# Altium integrated library LEMO Unipole And Multipole Type Connectors.IntLib: 1566 symbols (part 4 of 13) (continued)
## EEG.2K.306.CLN
designator J?
Fixed receptacle, nut fixing, with straight contacts for printed circuit (back panel mounting), Key (G), 2K series, Multipole Type with 6 Contacts; Manufacturer: LEMO; PartNumber: EEG.2K.306.CLN; Number of contacts: 6; Contact Diameter: 1.3 mm; AWG: 20; Rated Current(A): 12; DatasheetVersion: Jun-14; PackageReference: EEG.2K.306.CLN; PackageDescription: Fixed receptacle, nut fixing, with straight contacts for printed circuit (back panel mounting), Key(G) for Printed Circuit; Supplier 1: Mouser; Supplier Part Number 1: 736-EEG2K306CLN; Supplier 2: Digi-Key; Supplier Part Number 2: EEG.2K.306.CLN-ND; ComponentLink1Description: Manufacturer URL; ComponentLink1URL: http://www.lemo.com; ComponentLink2Description: Datasheet; ComponentLink2URL: http://intra.lemo.ch/catalog/ROW/UK_English/unipole_multipole.pdf
footprint EEG.2K.306.CLN (Socket, Female, Body 20mm dia. Height 25.8 mm, Through hole)
pins: 1, 2, 3, 4, 5, 6

## EEG.2K.306.CLV
designator J?
Fixed receptacle, nut fixing, with elbow contacts for printed circuit (back panel mounting), Key (G), 2K series, Multipole Type with 6 Contacts; Manufacturer: LEMO; PartNumber: EEG.2K.306.CLV; Number of contacts: 6; Contact Diameter: 1.3 mm; AWG: 20; Rated Current(A): 0; DatasheetVersion: Jun-14; PackageReference: EEG.2K.306.CLV; PackageDescription: Fixed receptacle, nut fixing, with elbow contacts for printed circuit (back panel mounting), Key(G) for Printed Circuit; Supplier 1: Mouser; Supplier Part Number 1: 736-EEG2K306CLV; Supplier 2: Digi-Key; Supplier Part Number 2: EEG.2K.306.CLV-ND; ComponentLink1Description: Manufacturer URL; ComponentLink1URL: http://www.lemo.com; ComponentLink2Description: Datasheet; ComponentLink2URL: http://intra.lemo.ch/catalog/ROW/UK_English/unipole_multipole.pdf
footprint EEG.2K.306.CLV (Socket, Female, Body 20mm dia. Height 26.6 mm, Through hole)
pins: 1, 2, 3, 4, 5, 6

## EEG.2K.307.CLN
designator J?
Fixed receptacle, nut fixing, with straight contacts for printed circuit (back panel mounting), Key (G), 2K series, Multipole Type with 7 Contacts; Manufacturer: LEMO; PartNumber: EEG.2K.307.CLN; Number of contacts: 7; Contact Diameter: 1.3 mm; AWG: 20; Rated Current(A): 11; DatasheetVersion: Jun-14; PackageReference: EEG.2K.307.CLN; PackageDescription: Fixed receptacle, nut fixing, with straight contacts for printed circuit (back panel mounting), Key(G) for Printed Circuit; Supplier 1: Mouser; Supplier Part Number 1: 736-EEG2K307CLN; Supplier 2: Digi-Key; Supplier Part Number 2: EEG.2K.307.CLN-ND; ComponentLink1Description: Manufacturer URL; ComponentLink1URL: http://www.lemo.com; ComponentLink2Description: Datasheet; ComponentLink2URL: http://intra.lemo.ch/catalog/ROW/UK_English/unipole_multipole.pdf
footprint EEG.2K.307.CLN (Socket, Female, Body 20mm dia. Height 25.8 mm, Through hole)
pins: 1, 2, 3, 4, 5, 6, 7

## EEG.2K.307.CLV
designator J?
Fixed receptacle, nut fixing, with elbow contacts for printed circuit (back panel mounting), Key (G), 2K series, Multipole Type with 7 Contacts; Manufacturer: LEMO; PartNumber: EEG.2K.307.CLV; Number of contacts: 7; Contact Diameter: 1.3 mm; AWG: 20; Rated Current(A): 0; DatasheetVersion: Jun-14; PackageReference: EEG.2K.307.CLV; PackageDescription: Fixed receptacle, nut fixing, with elbow contacts for printed circuit (back panel mounting), Key(G) for Printed Circuit; ComponentLink1Description: Manufacturer URL; ComponentLink1URL: http://www.lemo.com; ComponentLink2Description: Datasheet; ComponentLink2URL: http://intra.lemo.ch/catalog/ROW/UK_English/unipole_multipole.pdf
footprint EEG.2K.307.CLV (Socket, Female, Body 20mm dia. Height 26.6 mm, Through hole)
pins: 1, 2, 3, 4, 5, 6, 7

## EEG.2K.308.CLN
designator J?
Fixed receptacle, nut fixing, with straight contacts for printed circuit (back panel mounting), Key (G), 2K series, Multipole Type with 8 Contacts; Manufacturer: LEMO; PartNumber: EEG.2K.308.CLN; Number of contacts: 8; Contact Diameter: 0.9 mm; AWG: 22; Rated Current(A): 10; DatasheetVersion: Jun-14; PackageReference: EEG.2K.308.CLN; PackageDescription: Fixed receptacle, nut fixing, with straight contacts for printed circuit (back panel mounting), Key(G) for Printed Circuit; ComponentLink1Description: Manufacturer URL; ComponentLink1URL: http://www.lemo.com; ComponentLink2Description: Datasheet; ComponentLink2URL: http://intra.lemo.ch/catalog/ROW/UK_English/unipole_multipole.pdf
footprint EEG.2K.308.CLN (Socket, Female, Body 20mm dia. Height 25.8 mm, Through hole)
pins: 1, 2, 3, 4, 5, 6, 7, 8

## EEG.2K.308.CLV
designator J?
Fixed receptacle, nut fixing, with elbow contacts for printed circuit (back panel mounting), Key (G), 2K series, Multipole Type with 8 Contacts; Manufacturer: LEMO; PartNumber: EEG.2K.308.CLV; Number of contacts: 8; Contact Diameter: 0.9 mm; AWG: 22; Rated Current(A): 6; DatasheetVersion: Jun-14; PackageReference: EEG.2K.308.CLV; PackageDescription: Fixed receptacle, nut fixing, with elbow contacts for printed circuit (back panel mounting), Key(G) for Printed Circuit; ComponentLink1Description: Manufacturer URL; ComponentLink1URL: http://www.lemo.com; ComponentLink2Description: Datasheet; ComponentLink2URL: http://intra.lemo.ch/catalog/ROW/UK_English/unipole_multipole.pdf
footprint EEG.2K.308.CLV (Socket, Female, Body 20mm dia. Height 26.6 mm, Through hole)
pins: 1, 2, 3, 4, 5, 6, 7, 8

## EEG.2K.310.CLN
designator J?
Fixed receptacle, nut fixing, with straight contacts for printed circuit (back panel mounting), Key (G), 2K series, Multipole Type with 10 Contacts; Manufacturer: LEMO; PartNumber: EEG.2K.310.CLN; Number of contacts: 10; Contact Diameter: 0.9 mm; AWG: 22; Rated Current(A): 8; DatasheetVersion: Jun-14; PackageReference: EEG.2K.310.CLN; PackageDescription: Fixed receptacle, nut fixing, with straight contacts for printed circuit (back panel mounting), Key(G) for Printed Circuit; Supplier 1: Mouser; Supplier Part Number 1: 736-EEG2K310CLN; Supplier 2: Digi-Key; Supplier Part Number 2: EEG.2K.310.CLN-ND; ComponentLink1Description: Manufacturer URL; ComponentLink1URL: http://www.lemo.com; ComponentLink2Description: Datasheet; ComponentLink2URL: http://intra.lemo.ch/catalog/ROW/UK_English/unipole_multipole.pdf
footprint EEG.2K.310.CLN (Socket, Female, Body 20mm dia. Height 25.8 mm, Through hole)
pins: 1, 2, 3, 4, 5, 6, 7, 8, 9, 10

## EEG.2K.312.CLN
designator J?
Fixed receptacle, nut fixing, with straight contacts for printed circuit (back panel mounting), Key (G), 2K series, Multipole Type with 12 Contacts; Manufacturer: LEMO; PartNumber: EEG.2K.312.CLN; Number of contacts: 12; Contact Diameter: 0.7 mm; AWG: 24; Rated Current(A): 7; DatasheetVersion: Jun-14; PackageReference: EEG.2K.312.CLN; PackageDescription: Fixed receptacle, nut fixing, with straight contacts for printed circuit (back panel mounting), Key(G) for Printed Circuit; Supplier 1: Mouser; Supplier Part Number 1: 736-EEG2K312CLN; Supplier 2: Digi-Key; Supplier Part Number 2: EEG.2K.312.CLN-ND; ComponentLink1Description: Manufacturer URL; ComponentLink1URL: http://www.lemo.com; ComponentLink2Description: Datasheet; ComponentLink2URL: http://intra.lemo.ch/catalog/ROW/UK_English/unipole_multipole.pdf
footprint EEG.2K.312.CLN (Socket, Female, Body 20mm dia. Height 25.8 mm, Through hole)
pins: 1, 2, 3, 4, 5, 6, 7, 8, 9, 10, 11, 12

## EEG.2K.314.CLN
designator J?
Fixed receptacle, nut fixing, with straight contacts for printed circuit (back panel mounting), Key (G), 2K series, Multipole Type with 14 Contacts; Manufacturer: LEMO; PartNumber: EEG.2K.314.CLN; Number of contacts: 14; Contact Diameter: 0.7 mm; AWG: 24; Rated Current(A): 6.5; DatasheetVersion: Jun-14; PackageReference: EEG.2K.314.CLN; PackageDescription: Fixed receptacle, nut fixing, with straight contacts for printed circuit (back panel mounting), Key(G) for Printed Circuit; Supplier 1: Mouser; Supplier Part Number 1: 736-EEG2K314CLN; Supplier 2: Digi-Key; Supplier Part Number 2: EEG.2K.314.CLN-ND; ComponentLink1Description: Manufacturer URL; ComponentLink1URL: http://www.lemo.com; ComponentLink2Description: Datasheet; ComponentLink2URL: http://intra.lemo.ch/catalog/ROW/UK_English/unipole_multipole.pdf
footprint EEG.2K.314.CLN (Socket, Female, Body 20mm dia. Height 25.8 mm, Through hole)
pins: 1, 2, 3, 4, 5, 6, 7, 8, 9, 10, 11, 12, 13, 14

## EEG.2K.316.CLN
designator J?
Fixed receptacle, nut fixing, with straight contacts for printed circuit (back panel mounting), Key (G), 2K series, Multipole Type with 16 Contacts; Manufacturer: LEMO; PartNumber: EEG.2K.316.CLN; Number of contacts: 16; Contact Diameter: 0.7 mm; AWG: 24; Rated Current(A): 6; DatasheetVersion: Jun-14; PackageReference: EEG.2K.316.CLN; PackageDescription: Fixed receptacle, nut fixing, with straight contacts for printed circuit (back panel mounting), Key(G) for Printed Circuit; Supplier 1: Mouser; Supplier Part Number 1: 736-EEG2K316CLN; Supplier 2: Digi-Key; Supplier Part Number 2: EEG.2K.316.CLN-ND; ComponentLink1Description: Manufacturer URL; ComponentLink1URL: http://www.lemo.com; ComponentLink2Description: Datasheet; ComponentLink2URL: http://intra.lemo.ch/catalog/ROW/UK_English/unipole_multipole.pdf
footprint EEG.2K.316.CLN (Socket, Female, Body 20mm dia. Height 25.8 mm, Through hole)
pins: 1, 2, 3, 4, 5, 6, 7, 8, 9, 10, 11, 12, 13, 14, 15, 16

## EEG.2K.318.CLN
designator J?
Fixed receptacle, nut fixing, with straight contacts for printed circuit (back panel mounting), Key (G), 2K series, Multipole Type with 18 Contacts; Manufacturer: LEMO; PartNumber: EEG.2K.318.CLN; Number of contacts: 18; Contact Diameter: 0.7 mm; AWG: 24; Rated Current(A): 5.5; DatasheetVersion: Jun-14; PackageReference: EEG.2K.318.CLN; PackageDescription: Fixed receptacle, nut fixing, with straight contacts for printed circuit (back panel mounting), Key(G) for Printed Circuit; ComponentLink1Description: Manufacturer URL; ComponentLink1URL: http://www.lemo.com; ComponentLink2Description: Datasheet; ComponentLink2URL: http://intra.lemo.ch/catalog/ROW/UK_English/unipole_multipole.pdf
footprint EEG.2K.318.CLN (Socket, Female, Body 20mm dia. Height 25.8 mm, Through hole)
pins: 1, 2, 3, 4, 5, 6, 7, 8, 9, 10, 11, 12, 13, 14, 15, 16, 17, 18

## EEG.2K.319.CLN
designator J?
Fixed receptacle, nut fixing, with straight contacts for printed circuit (back panel mounting), Key (G), 2K series, Multipole Type with 19 Contacts; Manufacturer: LEMO; PartNumber: EEG.2K.319.CLN; Number of contacts: 19; Contact Diameter: 0.7 mm; AWG: 24; Rated Current(A): 5; DatasheetVersion: Jun-14; PackageReference: EEG.2K.319.CLN; PackageDescription: Fixed receptacle, nut fixing, with straight contacts for printed circuit (back panel mounting), Key(G) for Printed Circuit; Supplier 1: Mouser; Supplier Part Number 1: 736-EEG2K319CLN; Supplier 2: Digi-Key; Supplier Part Number 2: EEG.2K.319.CLN-ND; ComponentLink1Description: Manufacturer URL; ComponentLink1URL: http://www.lemo.com; ComponentLink2Description: Datasheet; ComponentLink2URL: http://intra.lemo.ch/catalog/ROW/UK_English/unipole_multipole.pdf
footprint EEG.2K.319.CLN (Socket, Female, Body 20mm dia. Height 25.8 mm, Through hole)
pins: 1, 2, 3, 4, 5, 6, 7, 8, 9, 10, 11, 12, 13, 14, 15, 16, 17, 18, 19

## EEG.3B.310.CLN
designator J?
Fixed receptacle, nut fixing with straight contacts for printed circuit(back panel mounting), Key (G), 3B series, Multipole Type with 10 Contacts; Manufacturer: LEMO; PartNumber: EEG.3B.310.CLN; Number of contacts: 10; Contact Diameter: 1.3 mm; AWG: 20; Rated Current(A): 12; DatasheetVersion: Jun-14; PackageReference: EEG.3B.310.CLN; PackageDescription: Fixed receptacle, nut fixing with straight contacts for printed circuit(back panel mounting), Key(G) for Printed Circuit; ComponentLink1Description: Manufacturer URL; ComponentLink1URL: http://www.lemo.com; ComponentLink2Description: Datasheet; ComponentLink2URL: http://intra.lemo.ch/catalog/ROW/UK_English/unipole_multipole.pdf
footprint EEG.3B.310.CLN (Socket, Female, Body 18mm dia. Height 28.1 mm, Through hole)
pins: 1, 2, 3, 4, 5, 6, 7, 8, 9, 10

## EEG.3B.312.CLN
designator J?
Fixed receptacle, nut fixing with straight contacts for printed circuit(back panel mounting), Key (G), 3B series, Multipole Type with 12 Contacts; Manufacturer: LEMO; PartNumber: EEG.3B.312.CLN; Number of contacts: 12; Contact Diameter: 0.9 mm; AWG: 22; Rated Current(A): 9; DatasheetVersion: Jun-14; PackageReference: EEG.3B.312.CLN; PackageDescription: Fixed receptacle, nut fixing with straight contacts for printed circuit(back panel mounting), Key(G) for Printed Circuit; Supplier 1: Mouser; Supplier Part Number 1: 736-EEG3B312CLN; Supplier 2: Digi-Key; Supplier Part Number 2: EEG.3B.312.CLN-ND; ComponentLink1Description: Manufacturer URL; ComponentLink1URL: http://www.lemo.com; ComponentLink2Description: Datasheet; ComponentLink2URL: http://intra.lemo.ch/catalog/ROW/UK_English/unipole_multipole.pdf
footprint EEG.3B.312.CLN (Socket, Female, Body 18mm dia. Height 28.1 mm, Through hole)
pins: 1, 2, 3, 4, 5, 6, 7, 8, 9, 10, 11, 12

## EEG.3B.312.CLV
designator J?
Fixed receptacle, nut fixing (back panel mounting), Key (G), 3B series, Multipole Type with 12 Contacts; Manufacturer: LEMO; PartNumber: EEG.3B.312.CLV; Number of contacts: 12; Contact Diameter: 0.9 mm; AWG: 22; Rated Current(A): 0; DatasheetVersion: Jun-14; PackageReference: EEG.3B.312.CLV; PackageDescription: Fixed receptacle, nut fixing (back panel mounting), Key(G) for Printed Circuit; Supplier 1: Mouser; Supplier Part Number 1: 736-EEG3B312CLV; Supplier 2: Digi-Key; Supplier Part Number 2: EEG.3B.312.CLV-ND; ComponentLink1Description: Manufacturer URL; ComponentLink1URL: http://www.lemo.com; ComponentLink2Description: Datasheet; ComponentLink2URL: http://intra.lemo.ch/catalog/ROW/UK_English/unipole_multipole.pdf
footprint EEG.3B.312.CLV (Socket, Female, Body 18mm dia. Height 28.1 mm, Through hole)
pins: 1, 2, 3, 4, 5, 6, 7, 8, 9, 10, 11, 12

## EEG.3B.314.CLN
designator J?
Fixed receptacle, nut fixing with straight contacts for printed circuit(back panel mounting), Key (G), 3B series, Multipole Type with 14 Contacts; Manufacturer: LEMO; PartNumber: EEG.3B.314.CLN; Number of contacts: 14; Contact Diameter: 0.9 mm; AWG: 22; Rated Current(A): 9; DatasheetVersion: Jun-14; PackageReference: EEG.3B.314.CLN; PackageDescription: Fixed receptacle, nut fixing with straight contacts for printed circuit(back panel mounting), Key(G) for Printed Circuit; Supplier 1: Mouser; Supplier Part Number 1: 736-EEG3B314CLN; Supplier 2: Digi-Key; Supplier Part Number 2: EEG.3B.314.CLN-ND; ComponentLink1Description: Manufacturer URL; ComponentLink1URL: http://www.lemo.com; ComponentLink2Description: Datasheet; ComponentLink2URL: http://intra.lemo.ch/catalog/ROW/UK_English/unipole_multipole.pdf
footprint EEG.3B.314.CLN (Socket, Female, Body 18mm dia. Height 28.1 mm, Through hole)
pins: 1, 2, 3, 4, 5, 6, 7, 8, 9, 10, 11, 12, 13, 14

## EEG.3B.316.CLN
designator J?
Fixed receptacle, nut fixing with straight contacts for printed circuit(back panel mounting), Key (G), 3B series, Multipole Type with 16 Contacts; Manufacturer: LEMO; PartNumber: EEG.3B.316.CLN; Number of contacts: 16; Contact Diameter: 0.9 mm; AWG: 22; Rated Current(A): 8; DatasheetVersion: Jun-14; PackageReference: EEG.3B.316.CLN; PackageDescription: Fixed receptacle, nut fixing with straight contacts for printed circuit(back panel mounting), Key(G) for Printed Circuit; Supplier 1: Mouser; Supplier Part Number 1: 736-EEG3B316CLN; Supplier 2: Digi-Key; Supplier Part Number 2: EEG.3B.316.CLN-ND; ComponentLink1Description: Manufacturer URL; ComponentLink1URL: http://www.lemo.com; ComponentLink2Description: Datasheet; ComponentLink2URL: http://intra.lemo.ch/catalog/ROW/UK_English/unipole_multipole.pdf
footprint EEG.3B.316.CLN (Socket, Female, Body 18mm dia. Height 28.1 mm, Through hole)
pins: 1, 2, 3, 4, 5, 6, 7, 8, 9, 10, 11, 12, 13, 14, 15, 16

## EEG.3B.318.CLN
designator J?
Fixed receptacle, nut fixing with straight contacts for printed circuit(back panel mounting), Key (G), 3B series, Multipole Type with 18 Contacts; Manufacturer: LEMO; PartNumber: EEG.3B.318.CLN; Number of contacts: 18; Contact Diameter: 0.9 mm; AWG: 22; Rated Current(A): 7; DatasheetVersion: Jun-14; PackageReference: EEG.3B.318.CLN; PackageDescription: Fixed receptacle, nut fixing with straight contacts for printed circuit(back panel mounting), Key(G) for Printed Circuit; Supplier 1: Mouser; Supplier Part Number 1: 736-EEG3B318CLN; Supplier 2: Digi-Key; Supplier Part Number 2: EEG.3B.318.CLN-ND; ComponentLink1Description: Manufacturer URL; ComponentLink1URL: http://www.lemo.com; ComponentLink2Description: Datasheet; ComponentLink2URL: http://intra.lemo.ch/catalog/ROW/UK_English/unipole_multipole.pdf
footprint EEG.3B.318.CLN (Socket, Female, Body 18mm dia. Height 28.1 mm, Through hole)
pins: 1, 2, 3, 4, 5, 6, 7, 8, 9, 10, 11, 12, 13, 14, 15, 16, 17, 18

## EEG.3B.320.CLN
designator J?
Fixed receptacle, nut fixing with straight contacts for printed circuit(back panel mounting), Key (G), 3B series, Multipole Type with 20 Contacts; Manufacturer: LEMO; PartNumber: EEG.3B.320.CLN; Number of contacts: 20; Contact Diameter: 0.7 mm; AWG: 24; Rated Current(A): 6; DatasheetVersion: Jun-14; PackageReference: EEG.3B.320.CLN; PackageDescription: Fixed receptacle, nut fixing with straight contacts for printed circuit(back panel mounting), Key(G) for Printed Circuit; Supplier 1: Mouser; Supplier Part Number 1: 736-EEG3B320CLN; Supplier 2: Digi-Key; Supplier Part Number 2: EEG.3B.320.CLN-ND; ComponentLink1Description: Manufacturer URL; ComponentLink1URL: http://www.lemo.com; ComponentLink2Description: Datasheet; ComponentLink2URL: http://intra.lemo.ch/catalog/ROW/UK_English/unipole_multipole.pdf
footprint EEG.3B.320.CLN (Socket, Female, Body 18mm dia. Height 28.1 mm, Through hole)
pins: 1, 2, 3, 4, 5, 6, 7, 8, 9, 10, 11, 12, 13, 14, 15, 16, 17, 18, 19, 20

## EEG.3B.320.CLV
designator J?
Fixed receptacle, nut fixing (back panel mounting), Key (G), 3B series, Multipole Type with 20 Contacts; Manufacturer: LEMO; PartNumber: EEG.3B.320.CLV; Number of contacts: 20; Contact Diameter: 0.7 mm; AWG: 24; Rated Current(A): 0; DatasheetVersion: Jun-14; PackageReference: EEG.3B.320.CLV; PackageDescription: Fixed receptacle, nut fixing (back panel mounting), Key(G) for Printed Circuit; ComponentLink1Description: Manufacturer URL; ComponentLink1URL: http://www.lemo.com; ComponentLink2Description: Datasheet; ComponentLink2URL: http://intra.lemo.ch/catalog/ROW/UK_English/unipole_multipole.pdf
footprint EEG.3B.320.CLV (Socket, Female, Body 18mm dia. Height 28.1 mm, Through hole)
pins: 1, 2, 3, 4, 5, 6, 7, 8, 9, 10, 11, 12, 13, 14, 15, 16, 17, 18, 19, 20

## EEG.3B.322.CLN
designator J?
Fixed receptacle, nut fixing with straight contacts for printed circuit(back panel mounting), Key (G), 3B series, Multipole Type with 22 Contacts; Manufacturer: LEMO; PartNumber: EEG.3B.322.CLN; Number of contacts: 22; Contact Diameter: 0.7 mm; AWG: 24; Rated Current(A): 5.5; DatasheetVersion: Jun-14; PackageReference: EEG.3B.322.CLN; PackageDescription: Fixed receptacle, nut fixing with straight contacts for printed circuit(back panel mounting), Key(G) for Printed Circuit; Supplier 1: Mouser; Supplier Part Number 1: 736-EEG3B322CLN; Supplier 2: Digi-Key; Supplier Part Number 2: EEG.3B.322.CLN-ND; ComponentLink1Description: Manufacturer URL; ComponentLink1URL: http://www.lemo.com; ComponentLink2Description: Datasheet; ComponentLink2URL: http://intra.lemo.ch/catalog/ROW/UK_English/unipole_multipole.pdf
footprint EEG.3B.322.CLN (Socket, Female, Body 18mm dia. Height 28.1 mm, Through hole)
pins: 1, 2, 3, 4, 5, 6, 7, 8, 9, 10, 11, 12, 13, 14, 15, 16, 17, 18, 19, 20, 21, 22

## EEG.3B.324.CLN
designator J?
Fixed receptacle, nut fixing with straight contacts for printed circuit(back panel mounting), Key (G), 3B series, Multipole Type with 24 Contacts; Manufacturer: LEMO; PartNumber: EEG.3B.324.CLN; Number of contacts: 24; Contact Diameter: 0.7 mm; Rated Current(A): 4; DatasheetVersion: Jun-14; PackageReference: EEG.3B.324.CLN; PackageDescription: Fixed receptacle, nut fixing with straight contacts for printed circuit(back panel mounting), Key(G) for Printed Circuit; Supplier 1: Mouser; Supplier Part Number 1: 736-EEG3B324CLN; Supplier 2: Digi-Key; Supplier Part Number 2: EEG.3B.324.CLN-ND; AWG: 24; ComponentLink1Description: Manufacturer URL; ComponentLink1URL: http://www.lemo.com; ComponentLink2Description: Datasheet; ComponentLink2URL: http://intra.lemo.ch/catalog/ROW/UK_English/unipole_multipole.pdf
footprint EEG.3B.324.CLN (Socket, Female, Body 18mm dia. Height 28.1 mm, Through hole)
pins: 1, 2, 3, 4, 5, 6, 7, 8, 9, 10, 11, 12, 13, 14, 15, 16, 17, 18, 19, 20, 21, 22, 23, 24

## EEG.3B.324.CLV
designator J?
Fixed receptacle, nut fixing (back panel mounting), Key (G), 3B series, Multipole Type with 24 Contacts; Manufacturer: LEMO; PartNumber: EEG.3B.324.CLV; Number of contacts: 24; Contact Diameter: 0.7 mm; Rated Current(A): 0; DatasheetVersion: Jun-14; PackageReference: EEG.3B.324.CLV; PackageDescription: Fixed receptacle, nut fixing (back panel mounting), Key(G) for Printed Circuit; AWG: 24; ComponentLink1Description: Manufacturer URL; ComponentLink1URL: http://www.lemo.com; ComponentLink2Description: Datasheet; ComponentLink2URL: http://intra.lemo.ch/catalog/ROW/UK_English/unipole_multipole.pdf
footprint EEG.3B.324.CLV (Socket, Female, Body 18mm dia. Height 28.1 mm, Through hole)
pins: 1, 2, 3, 4, 5, 6, 7, 8, 9, 10, 11, 12, 13, 14, 15, 16, 17, 18, 19, 20, 21, 22, 23, 24

## EEG.3K.307.CLN
designator J?
Fixed receptacle, nut fixing, with straight contacts for printed circuit (back panel mounting), Key (G), 3K series, Multipole Type with 7 Contacts; Manufacturer: LEMO; PartNumber: EEG.3K.307.CLN; Number of contacts: 7; Contact Diameter: 1.6 mm; AWG: 16; Rated Current(A): 15; DatasheetVersion: Jun-14; PackageReference: EEG.3K.307.CLN; PackageDescription: Fixed receptacle, nut fixing, with straight contacts for printed circuit (back panel mounting), Key(G) for Printed Circuit; ComponentLink1Description: Manufacturer URL; ComponentLink1URL: http://www.lemo.com; ComponentLink2Description: Datasheet; ComponentLink2URL: http://intra.lemo.ch/catalog/ROW/UK_English/unipole_multipole.pdf
footprint EEG.3K.307.CLN (Socket, Female, Body 24mm dia. Height 31.3 mm, Through hole)
pins: 1, 2, 3, 4, 5, 6, 7

## EEG.3K.308.CLN
designator J?
Fixed receptacle, nut fixing, with straight contacts for printed circuit (back panel mounting), Key (G), 3K series, Multipole Type with 8 Contacts; Manufacturer: LEMO; PartNumber: EEG.3K.308.CLN; Number of contacts: 8; Contact Diameter: 1.3 mm; AWG: 20; Rated Current(A): 13; DatasheetVersion: Jun-14; PackageReference: EEG.3K.308.CLN; PackageDescription: Fixed receptacle, nut fixing, with straight contacts for printed circuit (back panel mounting), Key(G) for Printed Circuit; ComponentLink1Description: Manufacturer URL; ComponentLink1URL: http://www.lemo.com; ComponentLink2Description: Datasheet; ComponentLink2URL: http://intra.lemo.ch/catalog/ROW/UK_English/unipole_multipole.pdf
footprint EEG.3K.308.CLN (Socket, Female, Body 24mm dia. Height 31.3 mm, Through hole)
pins: 1, 2, 3, 4, 5, 6, 7, 8

## EEG.3K.312.CLN
designator J?
Fixed receptacle, nut fixing, with straight contacts for printed circuit (back panel mounting), Key (G), 3K series, Multipole Type with 12 Contacts; Manufacturer: LEMO; PartNumber: EEG.3K.312.CLN; Number of contacts: 12; Contact Diameter: 0.9 mm; AWG: 22; Rated Current(A): 9; DatasheetVersion: Jun-14; PackageReference: EEG.3K.312.CLN; PackageDescription: Fixed receptacle, nut fixing, with straight contacts for printed circuit (back panel mounting), Key(G) for Printed Circuit; Supplier 1: Mouser; Supplier Part Number 1: 736-EEG3K312CLN; Supplier 2: Digi-Key; Supplier Part Number 2: EEG.3K.312.CLN-ND; ComponentLink1Description: Manufacturer URL; ComponentLink1URL: http://www.lemo.com; ComponentLink2Description: Datasheet; ComponentLink2URL: http://intra.lemo.ch/catalog/ROW/UK_English/unipole_multipole.pdf
footprint EEG.3K.312.CLN (Socket, Female, Body 24mm dia. Height 31.3 mm, Through hole)
pins: 1, 2, 3, 4, 5, 6, 7, 8, 9, 10, 11, 12

## EEG.3K.320.CLN
designator J?
Fixed receptacle, nut fixing, with straight contacts for printed circuit (back panel mounting), Key (G), 3K series, Multipole Type with 20 Contacts; Manufacturer: LEMO; PartNumber: EEG.3K.320.CLN; Number of contacts: 20; Contact Diameter: 0.7 mm; AWG: 24; Rated Current(A): 6; DatasheetVersion: Jun-14; PackageReference: EEG.3K.320.CLN; PackageDescription: Fixed receptacle, nut fixing, with straight contacts for printed circuit (back panel mounting), Key(G) for Printed Circuit; ComponentLink1Description: Manufacturer URL; ComponentLink1URL: http://www.lemo.com; ComponentLink2Description: Datasheet; ComponentLink2URL: http://intra.lemo.ch/catalog/ROW/UK_English/unipole_multipole.pdf
footprint EEG.3K.320.CLN (Socket, Female, Body 24mm dia. Height 31.3 mm, Through hole)
pins: 1, 2, 3, 4, 5, 6, 7, 8, 9, 10, 11, 12, 13, 14, 15, 16, 17, 18, 19, 20

## EEG.3K.324.CLN
designator J?
Fixed receptacle, nut fixing, with straight contacts for printed circuit (back panel mounting), Key (G), 3K series, Multipole Type with 24 Contacts; Manufacturer: LEMO; PartNumber: EEG.3K.324.CLN; Number of contacts: 24; Contact Diameter: 0.7 mm; Rated Current(A): 4; DatasheetVersion: Jun-14; PackageReference: EEG.3K.324.CLN; PackageDescription: Fixed receptacle, nut fixing, with straight contacts for printed circuit (back panel mounting), Key(G) for Printed Circuit; AWG: 24; ComponentLink1Description: Manufacturer URL; ComponentLink1URL: http://www.lemo.com; ComponentLink2Description: Datasheet; ComponentLink2URL: http://intra.lemo.ch/catalog/ROW/UK_English/unipole_multipole.pdf
footprint EEG.3K.324.CLN (Socket, Female, Body 24mm dia. Height 31.3 mm, Through hole)
pins: 1, 2, 3, 4, 5, 6, 7, 8, 9, 10, 11, 12, 13, 14, 15, 16, 17, 18, 19, 20, 21, 22, 23, 24

## EEG.4K.316.CLN
designator J?
Fixed receptacle, nut fixing (back panel mounting), Key (G), 4K series, Multipole Type with 16 Contacts; Manufacturer: LEMO; PartNumber: EEG.4K.316.CLN; Number of contacts: 16; Contact Diameter: 0.9 mm; AWG: 22; Rated Current(A): 10; DatasheetVersion: Jun-14; PackageReference: EEG.4K.316.CLN; PackageDescription: Fixed receptacle, nut fixing (back panel mounting), Key(G) for Printed Circuit; ComponentLink1Description: Manufacturer URL; ComponentLink1URL: http://www.lemo.com; ComponentLink2Description: Datasheet; ComponentLink2URL: http://intra.lemo.ch/catalog/ROW/UK_English/unipole_multipole.pdf
footprint EEG.4K.316.CLN (Socket, Female, Body 30mm dia., Through hole)
pins: 1, 2, 3, 4, 5, 6, 7, 8, 9, 10, 11, 12, 13, 14, 15, 16

## EEP.0E.303.CLN
designator J?
Fixed receptacle, nut fixing (back panel mounting), Key (P), 0E series, Multipole Type with 3 Contacts; Manufacturer: LEMO; PartNumber: EEP.0E.303.CLN; Number of contacts: 3; Contact Diameter: 0.7 mm; AWG: 24; Rated Current(A): 7; DatasheetVersion: Jun-14; PackageReference: EEP.0E.303.CLN; PackageDescription: Fixed receptacle, nut fixing (back panel mounting), Key(P) for Printed Circuit; ComponentLink1Description: Manufacturer URL; ComponentLink1URL: http://www.lemo.com; ComponentLink2Description: Datasheet; ComponentLink2URL: http://intra.lemo.ch/catalog/ROW/UK_English/unipole_multipole.pdf
footprint EEP.0E.303.CLN (Socket, Female, Through hole)
pins: 1, 2, 3

## EEP.1E.303.CLN
designator J?
Fixed receptacle, nut fixing, with straight contact for printed circuit (back panel mounting), Key (P), 1E series, Multipole Type with 3 Contacts; Manufacturer: LEMO; PartNumber: EEP.1E.303.CLN; Number of contacts: 3; Contact Diameter: 0.9 mm; AWG: 22; Rated Current(A): 10; DatasheetVersion: Jun-14; PackageReference: EEP.1E.303.CLN; PackageDescription: Fixed receptacle, nut fixing, with straight contact for printed circuit (back panel mounting), Key(P) for Printed Circuit; ComponentLink1Description: Manufacturer URL; ComponentLink1URL: http://www.lemo.com; ComponentLink2Description: Datasheet; ComponentLink2URL: http://intra.lemo.ch/catalog/ROW/UK_English/unipole_multipole.pdf
footprint EEP.1E.303.CLN (Socket, Female, Body 16mm dia. Height 23.5 mm, Through hole)
pins: 1, 2, 3

## EEP.1E.304.CLN
designator J?
Fixed receptacle, nut fixing, with straight contact for printed circuit (back panel mounting), Key (P), 1E series, Multipole Type with 4 Contacts; Manufacturer: LEMO; PartNumber: EEP.1E.304.CLN; Number of contacts: 4; Contact Diameter: 0.9 mm; AWG: 22; Rated Current(A): 10; DatasheetVersion: Jun-14; PackageReference: EEP.1E.304.CLN; PackageDescription: Fixed receptacle, nut fixing, with straight contact for printed circuit (back panel mounting), Key(P) for Printed Circuit; ComponentLink1Description: Manufacturer URL; ComponentLink1URL: http://www.lemo.com; ComponentLink2Description: Datasheet; ComponentLink2URL: http://intra.lemo.ch/catalog/ROW/UK_English/unipole_multipole.pdf
footprint EEP.1E.304.CLN (Socket, Female, Body 16mm dia. Height 23.5 mm, Through hole)
pins: 1, 2, 3, 4

## EEP.1E.306.CLN
designator J?
Fixed receptacle, nut fixing, with straight contact for printed circuit (back panel mounting), Key (P), 1E series, Multipole Type with 6 Contacts; Manufacturer: LEMO; PartNumber: EEP.1E.306.CLN; Number of contacts: 6; Contact Diameter: 0.7 mm; AWG: 24; Rated Current(A): 7; DatasheetVersion: Jun-14; PackageReference: EEP.1E.306.CLN; PackageDescription: Fixed receptacle, nut fixing, with straight contact for printed circuit (back panel mounting), Key(P) for Printed Circuit; ComponentLink1Description: Manufacturer URL; ComponentLink1URL: http://www.lemo.com; ComponentLink2Description: Datasheet; ComponentLink2URL: http://intra.lemo.ch/catalog/ROW/UK_English/unipole_multipole.pdf
footprint EEP.1E.306.CLN (Socket, Female, Body 16mm dia. Height 23.5 mm, Through hole)
pins: 1, 2, 3, 4, 5, 6

## EEP.1S.304.CLN
designator J?
Fixed receptacle, nut fixing (back panel mounting), 1S series, Multipole Type with 4 Contacts; Manufacturer: LEMO; PartNumber: EEP.1S.304.CLN; Number of contacts: 4; Contact Diameter: 0.9 mm; AWG: 22; Rated Current(A): 10; DatasheetVersion: Jun-14; PackageReference: EEP.1S.304.CLN; PackageDescription: Fixed receptacle, nut fixing (back panel mounting),  for Printed Circuit; ComponentLink1Description: Manufacturer URL; ComponentLink1URL: http://www.lemo.com; ComponentLink2Description: Datasheet; ComponentLink2URL: http://intra.lemo.ch/catalog/ROW/UK_English/unipole_multipole.pdf
footprint EEP.1S.304.CLN (Socket, Female, Through hole)
pins: 1, 2, 3, 4

## EEP.1S.305.CLN
designator J?
Fixed receptacle, nut fixing (back panel mounting), 1S series, Multipole Type with 5 Contacts; Manufacturer: LEMO; PartNumber: EEP.1S.305.CLN; Number of contacts: 5; AWG: 0; DatasheetVersion: Jun-14; PackageReference: EEP.1S.305.CLN; PackageDescription: Fixed receptacle, nut fixing (back panel mounting),  for Printed Circuit; Supplier 1: Mouser; Supplier Part Number 1: 736-EEP.1S.305.CLN; Supplier 2: Digi-Key; Supplier Part Number 2: EEP.1S.305.CLN-ND; Rated Current(A): 0; ComponentLink1Description: Manufacturer URL; ComponentLink1URL: http://www.lemo.com; ComponentLink2Description: Datasheet; ComponentLink2URL: http://intra.lemo.ch/catalog/ROW/UK_English/unipole_multipole.pdf
footprint EEP.1S.305.CLN (Socket, Female, Through hole)
pins: 1, 2, 3, 4, 5

## EEP.2E.308.CLN
designator J?
Fixed receptacle, nut fixing (back panel mounting), Key (P), 2E series, Multipole Type with 8 Contacts; Manufacturer: LEMO; PartNumber: EEP.2E.308.CLN; Number of contacts: 8; Contact Diameter: 0.9 mm; AWG: 22; Rated Current(A): 9; DatasheetVersion: Jun-14; PackageReference: EEP.2E.308.CLN; PackageDescription: Fixed receptacle, nut fixing (back panel mounting), Key(P) for Printed Circuit; ComponentLink1Description: Manufacturer URL; ComponentLink1URL: http://www.lemo.com; ComponentLink2Description: Datasheet; ComponentLink2URL: http://intra.lemo.ch/catalog/ROW/UK_English/unipole_multipole.pdf
footprint EEP.2E.308.CLN (Socket, Female, Body 20mm dia., Through hole)
pins: 1, 2, 3, 4, 5, 6, 7, 8
